# Altium footprint library 未分类器件.PcbLib: 80 footprints (part 2 of 5)
Each footprint in its own frame and in the unit in brackets; x right, y up, seen from the top. Pads: shape width x height; smd on the part's side, far side on the other; paste and mask are expansions set on the pad; w line width, h text height; cw(c..) or ccw(c..) is an arc to the next point about the centre after c.
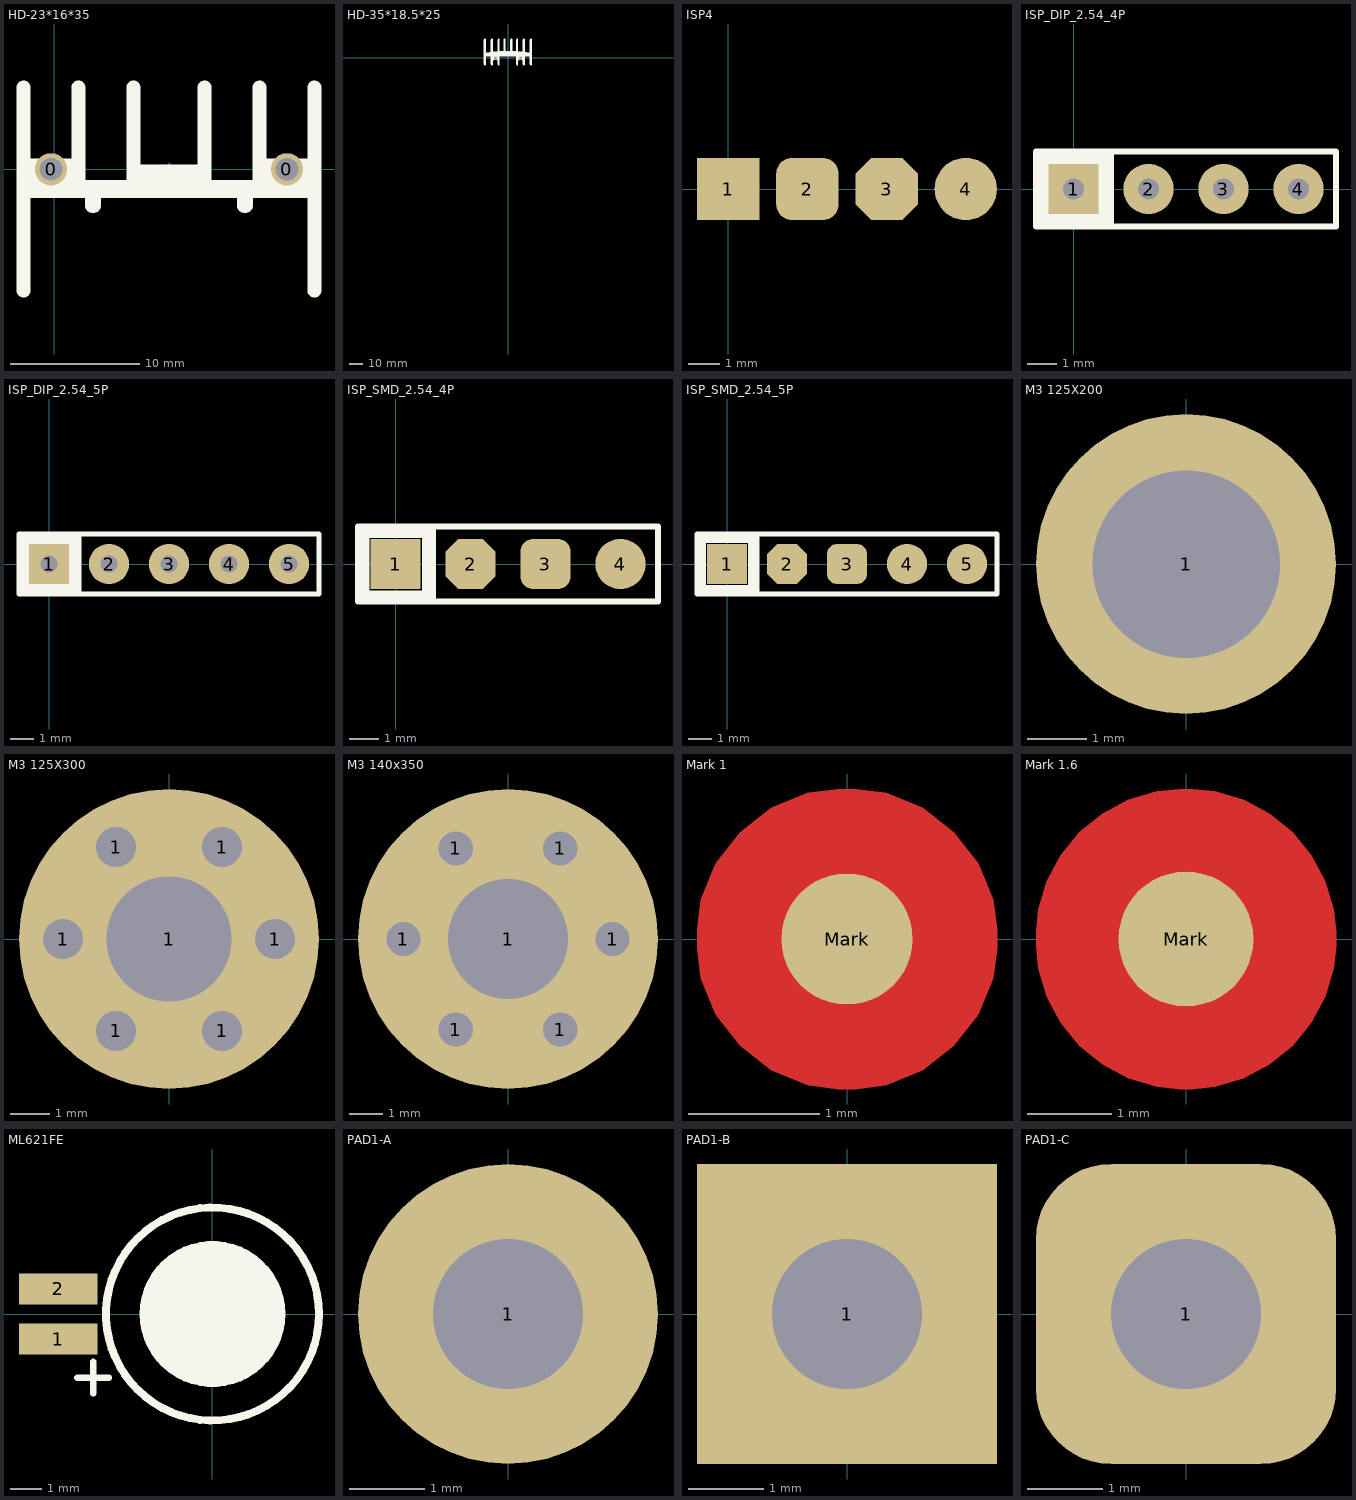
[diagram p1: the footprints below, top view; thin cyan lines are the x and y axes]

## HD-23*16*35 [mm] "散热片"
pads (2):
  round 2.5 / inner round 3.5 / far side round 3.5 hole 1.75: 0(-0.25,0) 0(18,0)
Top Overlay:
  drawing of 79 lines, arcs and shapes, not listed
Mechanical 15:
  circle w0.05: c8.875,0 r0.35
  lines w0.05: 8.375,0 9.375,0 ; 8.875,-0.5 8.875,0.5
3D body: height 35.02, standoff -3.59, extent -2.725,-9.725 20.475,6.675

## HD-35*18.5*25 [mm] "散热片"
pads (2):
  round 2.5 hole 1.35: 0(-9.5,0) 0(9.5,0)
Top Overlay:
  drawing of 85 lines, arcs and shapes, not listed
Mechanical 15:
  circle w0.05: c0,0 r0.35
  lines w0.05: -0.5,0 0.5,0 ; 0,-0.5 0,0.5
3D body: height 25.02, standoff -3.59, extent -18,-5.2 18,14.3

## ISP4 [mm] "4P测试点"
pads (4):
  rect 2x2 smd: 1(0,0)
  rrect50% 2x2 smd: 2(2.54,0)
  oct 2x2 smd: 3(5.08,0)
  round 2 smd: 4(7.62,0)

## ISP_DIP_2.54_4P [mm] "4P 下载端口"
pads (4):
  rect 1.7x1.7 hole 0.7: 1(0,0)
  round 1.7 hole 0.7: 2(2.54,0) 3(5.08,0) 4(7.62,0)
Top Overlay:
  rectangle: -1.27,-1.27 1.27,1.27
  lines w0.203: 1.27,-1.27 1.27,1.27 ; -1.27,-1.27 -1.27,1.27 8.89,1.27 8.89,-1.27 -1.27,-1.27

## ISP_DIP_2.54_5P [mm] "5P 下载端口"
pads (5):
  rect 1.7x1.7 hole 0.7: 1(0,0)
  round 1.7 hole 0.7: 2(2.54,0) 3(5.08,0) 4(7.62,0) 5(10.16,0)
Top Overlay:
  rectangle: -1.27,-1.27 1.27,1.27
  lines w0.203: 1.27,-1.27 1.27,1.27 ; -1.27,-1.27 11.43,-1.27 11.43,1.27 -1.27,1.27 -1.27,-1.27

## ISP_SMD_2.54_4P [mm] "4P 下载端口"
pads (4):
  rect 1.7x1.7 smd paste-2: 1(0,0)
  oct 1.7x1.7 smd paste-2: 2(2.54,0)
  rrect50% 1.7x1.7 smd paste-2: 3(5.08,0)
  round 1.7 smd paste-2: 4(7.62,0)
Top Overlay:
  rectangle: -1.27,-1.27 -0.889,1.27
  rectangle: -0.889,-1.27 1.27,-0.889
  rectangle: 0.889,-0.889 1.27,1.27
  rectangle: -1.143,0.889 0.889,1.27
  lines w0.203: 1.27,-1.27 1.27,1.27 ; -1.27,-1.27 8.89,-1.27 8.89,1.27 -1.27,1.27 -1.27,-1.27

## ISP_SMD_2.54_5P [mm] "5P 下载端口"
pads (5):
  rect 1.7x1.7 smd paste-2: 1(0,0)
  oct 1.7x1.7 smd paste-2: 2(2.54,0)
  rrect50% 1.7x1.7 smd paste-2: 3(5.08,0)
  round 1.7 smd paste-2: 4(7.62,0) 5(10.16,0)
Top Overlay:
  rectangle: -1.27,0.889 1.016,1.27
  rectangle: 0.889,-0.889 1.27,1.27
  rectangle: -0.889,-1.27 1.27,-0.889
  rectangle: -1.27,-1.27 -0.889,1.27
  lines w0.203: 1.27,-1.27 1.27,1.27 ; -1.27,-1.27 11.43,-1.27 11.43,1.27 -1.27,1.27 -1.27,-1.27

## M3 125X200 [mm] "M3螺丝孔，孔125Mil，焊盘200Mil"
pads (1):
  round 5.08 hole 3.175: 1(0,0)

## M3 125X300 [mil] "M3螺丝孔，孔125Mil，焊盘300Mil"
pads (7):
  round 40 hole 40: 1(-106,0) 1(-53,-91.8) 1(-53,91.8) 1(53,-91.8) 1(53,91.8) 1(106,0)
  round 300 hole 125: 1(0,0)

## M3 140x350 [mil] "M3螺丝孔，孔140Mil，焊盘350Mil"
pads (7):
  round 35 hole 40: 1(-122,0) 1(-61,-105.66) 1(-61,105.66) 1(61,-105.66) 1(61,105.66) 1(122,0)
  round 350 hole 140: 1(0,0)

## Mark 1 [mm] "光学定位点，直径1mm"
pads (1):
  round 1 smd paste-1 mask+0.635: Mark(0,0)
Top Layer:
  pour cut-out: 0,-1.143 -0.075,-1.143 -0.298,-1.114 -0.576,-0.998 -0.815,-0.815 -0.998,-0.576 -1.114,-0.298 -1.143,-0.075 -1.143,0 -1.143,0.075 -1.114,0.298 -0.998,0.576 -0.815,0.815 -0.576,0.998 -0.298,1.114 -0.075,1.143 0,1.143 0.075,1.143 0.298,1.114 0.576,0.998 0.815,0.815 0.998,0.576 1.114,0.298 1.143,0.075 1.143,0 1.143,-0.075 1.114,-0.298 0.998,-0.576 0.815,-0.815 0.576,-0.998 0.298,-1.114 0.075,-1.143

## Mark 1.6 [mm] "光学定位点，直径1.6mm"
pads (1):
  round 1.6 smd paste-1.6 mask+0.889: Mark(0,0)
Top Layer:
  pour cut-out: 0,-1.778 -0.087,-1.778 -0.349,-1.752 -0.684,-1.651 -0.993,-1.486 -1.263,-1.263 -1.486,-0.993 -1.651,-0.684 -1.752,-0.349 -1.778,-0.087 -1.778,0 -1.778,0.087 -1.752,0.349 -1.651,0.684 -1.486,0.993 -1.263,1.263 -0.993,1.486 -0.684,1.651 -0.349,1.752 -0.087,1.778 0,1.778 0.087,1.778 0.349,1.752 0.684,1.651 0.993,1.486 1.263,1.263 1.486,0.993 1.651,0.684 1.752,0.349 1.778,0.087 1.778,0 1.778,-0.087 1.752,-0.349 1.651,-0.684 1.486,-0.993 1.263,-1.263 0.993,-1.486 0.684,-1.651 0.349,-1.752 0.087,-1.778

## ML621FE [mm] "可充电纽扣电池"
pads (2):
  rect 2.5x1 smd: 1(-4.927,-0.8) 2(-4.927,0.8)
Top Overlay:
  circle w0.254: c0,0 r3.4
  circle w0.254: c0,0 r2.2
  circle w2.2: c0,0 r1.024
  lines w0.203: -4.318,-2.032 -3.302,-2.032 ; -3.81,-2.54 -3.81,-1.524
Mechanical 15:
  circle w0.05: c0,0 r0.35
  lines w0.05: -0.5,0 0.5,0 ; 0,-0.5 0,0.5
3D body: height 2.45, standoff 0.04, extent -5.5,-3.398 3.398,3.398

## PAD1-A [mm] "引线焊盘"
pads (1):
  round 4 hole 2: 1(0,0)

## PAD1-B [mm] "引线焊盘"
pads (1):
  rect 4x4 hole 2: 1(0,0)

## PAD1-C [mm] "引线焊盘"
pads (1):
  rrect50% 4x4 hole 2: 1(0,0)